# Altium footprint library Universal components.PcbLib: 101 footprints (part 4 of 7)
Each footprint in its own frame and in the unit in brackets; x right, y up, seen from the top. Pads: shape width x height; smd on the part's side, far side on the other; paste and mask are expansions set on the pad; w line width, h text height; cw(c..) or ccw(c..) is an arc to the next point about the centre after c.
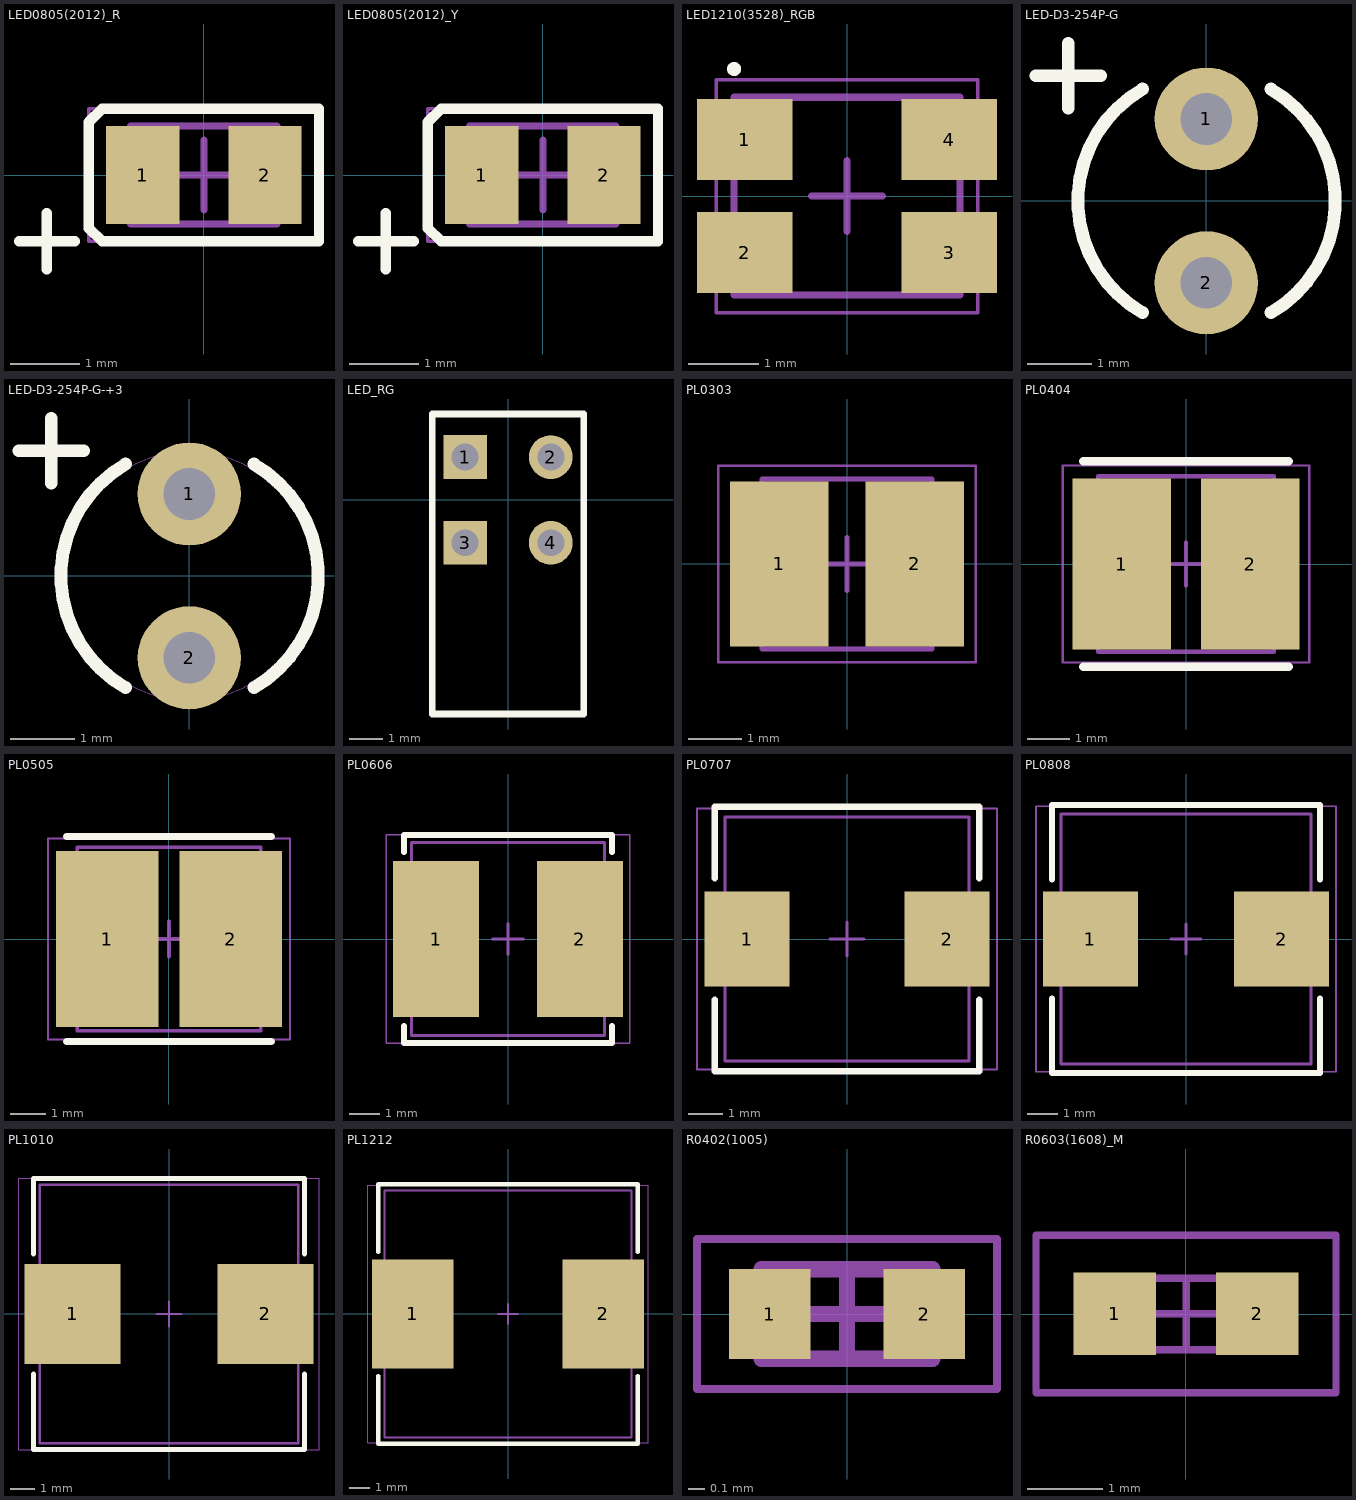
[diagram p3: the footprints below, top view; thin cyan lines are the x and y axes]

## LED0805(2012)_R [mm] "Chip Resistor, 2-Leads, Body 2.00x1.27mm, IPC Medium Density"
height 0.6
pads (2):
  rect 1.05x1.4 smd: 1(-0.875,0) 2(0.875,0)
Top Overlay:
  lines w0.15: -2.65,-0.95 -1.85,-0.95 ; -2.25,-1.35 -2.25,-0.55 ; -1.65,-0.76 -1.65,0.76 -1.46,0.95 1.65,0.95 1.65,-0.95 -1.46,-0.95 -1.65,-0.76
Mechanical 13:
  lines w0.1: -1.05,-0.7 -1.05,0.7 1.05,0.7 1.05,-0.7 -1.05,-0.7
Mechanical 15:
  lines w0.05: -1.65,-0.95 -1.65,0.95 1.65,0.95 1.65,-0.95 -1.65,-0.95
  lines w0.1: -0.5,0 0.5,0 ; 0,-0.5 0,0.5
3D body "User Library-led_0805_R.step": height 1.1, standoff 0, extent -1.01,-0.625 1.01,0.625

## LED0805(2012)_Y [mm] "Chip Resistor, 2-Leads, Body 2.00x1.27mm, IPC Medium Density"
height 0.6
pads (2):
  rect 1.05x1.4 smd: 1(-0.875,0) 2(0.875,0)
Top Overlay:
  lines w0.15: -2.65,-0.95 -1.85,-0.95 ; -2.25,-1.35 -2.25,-0.55 ; -1.65,-0.76 -1.65,0.76 -1.46,0.95 1.65,0.95 1.65,-0.95 -1.46,-0.95 -1.65,-0.76
Mechanical 13:
  lines w0.1: -1.05,-0.7 -1.05,0.7 1.05,0.7 1.05,-0.7 -1.05,-0.7
Mechanical 15:
  lines w0.05: -1.65,-0.95 -1.65,0.95 1.65,0.95 1.65,-0.95 -1.65,-0.95
  lines w0.1: -0.5,0 0.5,0 ; 0,-0.5 0,0.5
3D body "User Library-led_0805_Y.step": height 1.1, standoff 0, extent -1.01,-0.625 1.01,0.625

## LED1210(3528)_RGB [mm]
pads (4):
  rect 1.35x1.15 smd: 1(-1.45,0.8) 2(-1.45,-0.8) 3(1.45,-0.8) 4(1.45,0.8)
Top Overlay:
  circle w0.1: c-1.6,1.8 r0.05
Mechanical 13:
  lines w0.1: -1.6,-1.4 -1.6,1.4 1.6,1.4 1.6,-1.4 -1.6,-1.4
Mechanical 15:
  lines w0.05: -1.85,-1.65 -1.85,1.65 1.85,1.65 1.85,-1.65 -1.85,-1.65
  lines w0.1: -0.5,0 0.5,0 ; 0,-0.5 0,0.5
3D body "User Library-PLCC4RGBCT-CA LED SMD RGB.step": height 1.87, standoff -0.03, extent -1.75,-1.4 1.75,1.4

## LED-D3-254P-G [mm]
pads (2):
  round 1.6 hole 0.8 paste+0 mask+0.1: 1(0,1.27) 2(0,-1.27)
Top Overlay:
  lines w0.2: -2.64,1.94 -1.64,1.94 ; -2.14,1.44 -2.14,2.44 ; -0.99,-1.732 cw(c0.01,0) -0.99,1.732 ; 1,-1.732 ccw(c0,0) 1,1.732
3D body "LEDd3G.STEP": height 5.51, standoff -2.49, extent -1.646,-1.664 1.654,1.636

## LED-D3-254P-G-+3 [mm]
pads (2):
  round 1.6 hole 0.8 paste+0 mask+0.1: 1(0,1.27) 2(0,-1.27)
Top Overlay:
  lines w0.2: -2.64,1.94 -1.64,1.94 ; -2.14,1.44 -2.14,2.44 ; -0.99,-1.732 cw(c0.01,0) -0.99,1.732 ; 1,-1.732 ccw(c0,0) 1,1.732
Mechanical 13:
  circle w0.01: c0,0 r1.925
3D body: height 3, standoff 0, extent -1.924,-1.924 1.924,1.924
3D body "LEDd3G.STEP": height 7.51, standoff -0.49, extent -1.654,-1.636 1.646,1.664

## LED_RG [mm]
pads (4):
  rect 1.3x1.3 hole 0.8 paste+0 mask+0.1: 1(-1.27,1.27) 3(-1.27,-1.27)
  round 1.3 hole 0.8 paste+0 mask+0.1: 2(1.27,1.27) 4(1.27,-1.27)
Top Overlay:
  lines w0.2: -2.25,-6.35 -2.25,2.55 2.25,2.55 2.25,-6.35 -2.25,-6.35
3D body "led-light.stp": height 10, standoff -9.2, extent -2.215,-8.85 2.235,2.55

## PL0303 [mm] "Precision Wire Wound Inductor, 2-Leads, Body 3.00x3.00mm, IPC Medium Density"
height 2
pads (2):
  rect 1.85x3.1 smd: 1(-1.275,0) 2(1.275,0)
Mechanical 13:
  lines w0.1: -1.6,-1.6 -1.6,1.6 1.6,1.6 1.6,-1.6 -1.6,-1.6
Mechanical 15:
  lines w0.05: -2.425,-1.85 -2.425,1.85 2.425,1.85 2.425,-1.85 -2.425,-1.85
  lines w0.1: -0.5,0 0.5,0 ; 0,-0.5 0,0.5
3D body "Coilcraft-LPR3015.step": height 1.5, standoff 0, extent -1.54,-1.54 1.54,1.54

## PL0404 [mm] "Precision Wire Wound Inductor, 2-Leads, Body 4.00x4.00mm, IPC Medium Density"
height 2.8
pads (2):
  rect 2.3x4 smd: 1(-1.5,0) 2(1.5,0)
Top Overlay:
  lines w0.2: -2.4,-2.4 2.4,-2.4 ; -2.4,2.4 2.4,2.4
Mechanical 13:
  lines w0.1: -2.05,-2.05 -2.05,2.05 2.05,2.05 2.05,-2.05 -2.05,-2.05
Mechanical 15:
  lines w0.05: -2.875,-2.3 -2.875,2.3 2.875,2.3 2.875,-2.3 -2.875,-2.3
  lines w0.1: -0.5,0 0.5,0 ; 0,-0.5 0,0.5
3D body "Coilcraft-XAL4030.step": height 3, standoff -0.1, extent -2.15,-2.15 2.15,2.15

## PL0505 [mm] "Precision Wire Wound Inductor, 2-Leads, Body 5.00x5.00mm, IPC Medium Density"
height 2.8
pads (2):
  rect 2.9x5 smd: 1(-1.75,0) 2(1.75,0)
Top Overlay:
  lines w0.2: -2.9,-2.9 2.9,-2.9 ; -2.9,2.9 2.9,2.9
Mechanical 13:
  lines w0.1: -2.6,-2.6 2.6,-2.6 2.6,2.6 -2.6,2.6 -2.6,-2.6
Mechanical 15:
  lines w0.05: -3.425,-2.85 3.425,-2.85 3.425,2.85 -3.425,2.85 -3.425,-2.85
  lines w0.1: -0.5,0 0.5,0 ; 0,-0.5 0,0.5
3D body "Coilcraft-XAL5030.step": height 3.13, standoff -0.1, extent -2.74,-2.84 2.74,2.84

## PL0606 [mm] "Precision Wire Wound Inductor, 2-Leads, Body 6.00x6.00mm, IPC Medium Density"
height 4.5
pads (2):
  rect 2.8x5.1 smd: 1(-2.35,0) 2(2.35,0)
Top Overlay:
  lines w0.2: -3.4,-2.85 -3.4,-3.4 3.4,-3.4 3.4,-2.85 ; -3.4,2.85 -3.4,3.4 3.4,3.4 3.4,2.85
Mechanical 13:
  lines w0.1: -3.15,-3.15 -3.15,3.15 3.15,3.15 3.15,-3.15 -3.15,-3.15
Mechanical 15:
  lines w0.05: -3.975,-3.4 -3.975,3.4 3.975,3.4 3.975,-3.4 -3.975,-3.4
  lines w0.1: -0.5,0 0.5,0 ; 0,-0.5 0,0.5
3D body "Coilcraft-XAL6060.step": height 6.13, standoff -0.1, extent -3.28,-3.38 3.28,3.38

## PL0707 [mm] "Precision Wire Wound Inductor, 2-Leads, Body 7.00x7.00mm, IPC Medium Density"
height 5
pads (2):
  rect 2.5x2.8 smd: 1(-2.95,0) 2(2.95,0)
Top Overlay:
  lines w0.2: -3.9,-1.8 -3.9,-3.9 3.9,-3.9 3.9,-1.8 ; -3.9,1.8 -3.9,3.9 3.9,3.9 3.9,1.8
Mechanical 13:
  lines w0.1: -3.6,-3.6 -3.6,3.6 3.6,3.6 3.6,-3.6 -3.6,-3.6
Mechanical 15:
  lines w0.05: -4.425,-3.85 -4.425,3.85 4.425,3.85 4.425,-3.85 -4.425,-3.85
  lines w0.1: -0.5,0 0.5,0 ; 0,-0.5 0,0.5
3D body "CDRN74.stp": height 4.39, standoff -0.11, extent -3.65,-3.65 3.65,3.65

## PL0808 [mm] "Precision Wire Wound Inductor, 2-Leads, Body 8.15x8.15mm, IPC Medium Density"
height 4.5
pads (2):
  rect 3.15x3.15 smd: 1(-3.175,0) 2(3.175,0)
Top Overlay:
  lines w0.2: -4.45,-1.975 -4.45,-4.45 4.45,-4.45 4.45,-1.975 ; -4.45,1.975 -4.45,4.45 4.45,4.45 4.45,1.975
Mechanical 13:
  lines w0.1: -4.15,-4.15 4.15,-4.15 4.15,4.15 -4.15,4.15 -4.15,-4.15
Mechanical 15:
  lines w0.05: -4.975,-4.4 4.975,-4.4 4.975,4.4 -4.975,4.4 -4.975,-4.4
  lines w0.1: -0.5,0 0.5,0 ; 0,-0.5 0,0.5
3D body "Coilcraft-SRT8045.step": height 4.6, standoff 0, extent -4.15,-4.35 4.15,4.35

## PL1010 [mm] "Precision Wire Wound Inductor, 2-Leads, Body 10.10x10.10mm, IPC Medium Density"
height 6.8
pads (2):
  rect 3.85x4 smd: 1(-3.875,0) 2(3.875,0)
Top Overlay:
  lines w0.2: -5.45,-2.4 -5.45,-5.45 5.45,-5.45 5.45,-2.4 ; -5.45,2.4 -5.45,5.45 5.45,5.45 5.45,2.4
Mechanical 13:
  lines w0.1: -5.2,-5.2 -5.2,5.2 5.2,5.2 5.2,-5.2 -5.2,-5.2
Mechanical 15:
  lines w0.05: -6.025,-5.45 -6.025,5.45 6.025,5.45 6.025,-5.45 -6.025,-5.45
  lines w0.1: -0.5,0 0.5,0 ; 0,-0.5 0,0.5
3D body "User Library-10x10 SMT Power Inductor.step": height 4.8, standoff 0, extent -5.2,-5.2 5.2,5.2

## PL1212 [mm] "Precision Wire Wound Inductor, 2-Leads, Body 12.00x12.00mm, IPC Medium Density"
height 8
pads (2):
  rect 4x5.4 smd: 1(-4.7,0) 2(4.7,0)
Top Overlay:
  lines w0.2: -6.4,-3.05 -6.4,-6.4 6.4,-6.4 6.4,-3.05 ; -6.4,3.05 -6.4,6.4 6.4,6.4 6.4,3.05
Mechanical 13:
  lines w0.1: -6.1,-6.1 -6.1,6.1 6.1,6.1 6.1,-6.1 -6.1,-6.1
Mechanical 15:
  lines w0.05: -6.925,-6.35 -6.925,6.35 6.925,6.35 6.925,-6.35 -6.925,-6.35
  lines w0.1: -0.5,0 0.5,0 ; 0,-0.5 0,0.5
3D body "User Library-DE1207.step": height 8, standoff 0, extent -6,-6 6,6

## R0402(1005) [mm] "Chip Resistor, 2-Leads, Body 1.00x0.50mm, IPC Medium Density"
height 0.4
pads (2):
  rect 0.5x0.55 smd: 1(-0.475,0) 2(0.475,0)
Mechanical 13:
  lines w0.1: -0.525,-0.275 -0.525,0.275 0.525,0.275 0.525,-0.275 -0.525,-0.275
Mechanical 15:
  lines w0.05: -0.92,-0.46 -0.92,0.46 0.92,0.46 0.92,-0.46 -0.92,-0.46
  lines w0.1: -0.275,0 0.275,0 ; 0,-0.275 0,0.275
3D body "R0402.STEP": height 0.35, standoff 0, extent -0.5,-0.25 0.5,0.25

## R0603(1608)_M [mm] "Chip Resistor, Body 1.6x0.8mm, IPC Low Density"
height 0.6
pads (2):
  rect 1.1x1.1 smd: 1(-0.95,0) 2(0.95,0)
Mechanical 13:
  lines w0.1: -0.85,-0.475 0.85,-0.475 0.85,0.475 -0.85,0.475 -0.85,-0.475
Mechanical 15:
  lines w0.1: -0.475,0 0.475,0 ; 0,-0.475 0,0.475 ; -2,-1.05 2,-1.05 2,1.05 -2,1.05 -2,-1.05
3D body "R0603.STEP": height 0.45, standoff 0, extent -0.8,-0.4 0.8,0.4